# Altium footprint library Sigma_Library.PcbLib: 125 footprints (part 6 of 8)
Each footprint in its own frame and in the unit in brackets; x right, y up, seen from the top. Pads: shape width x height; smd on the part's side, far side on the other; paste and mask are expansions set on the pad; w line width, h text height; cw(c..) or ccw(c..) is an arc to the next point about the centre after c.
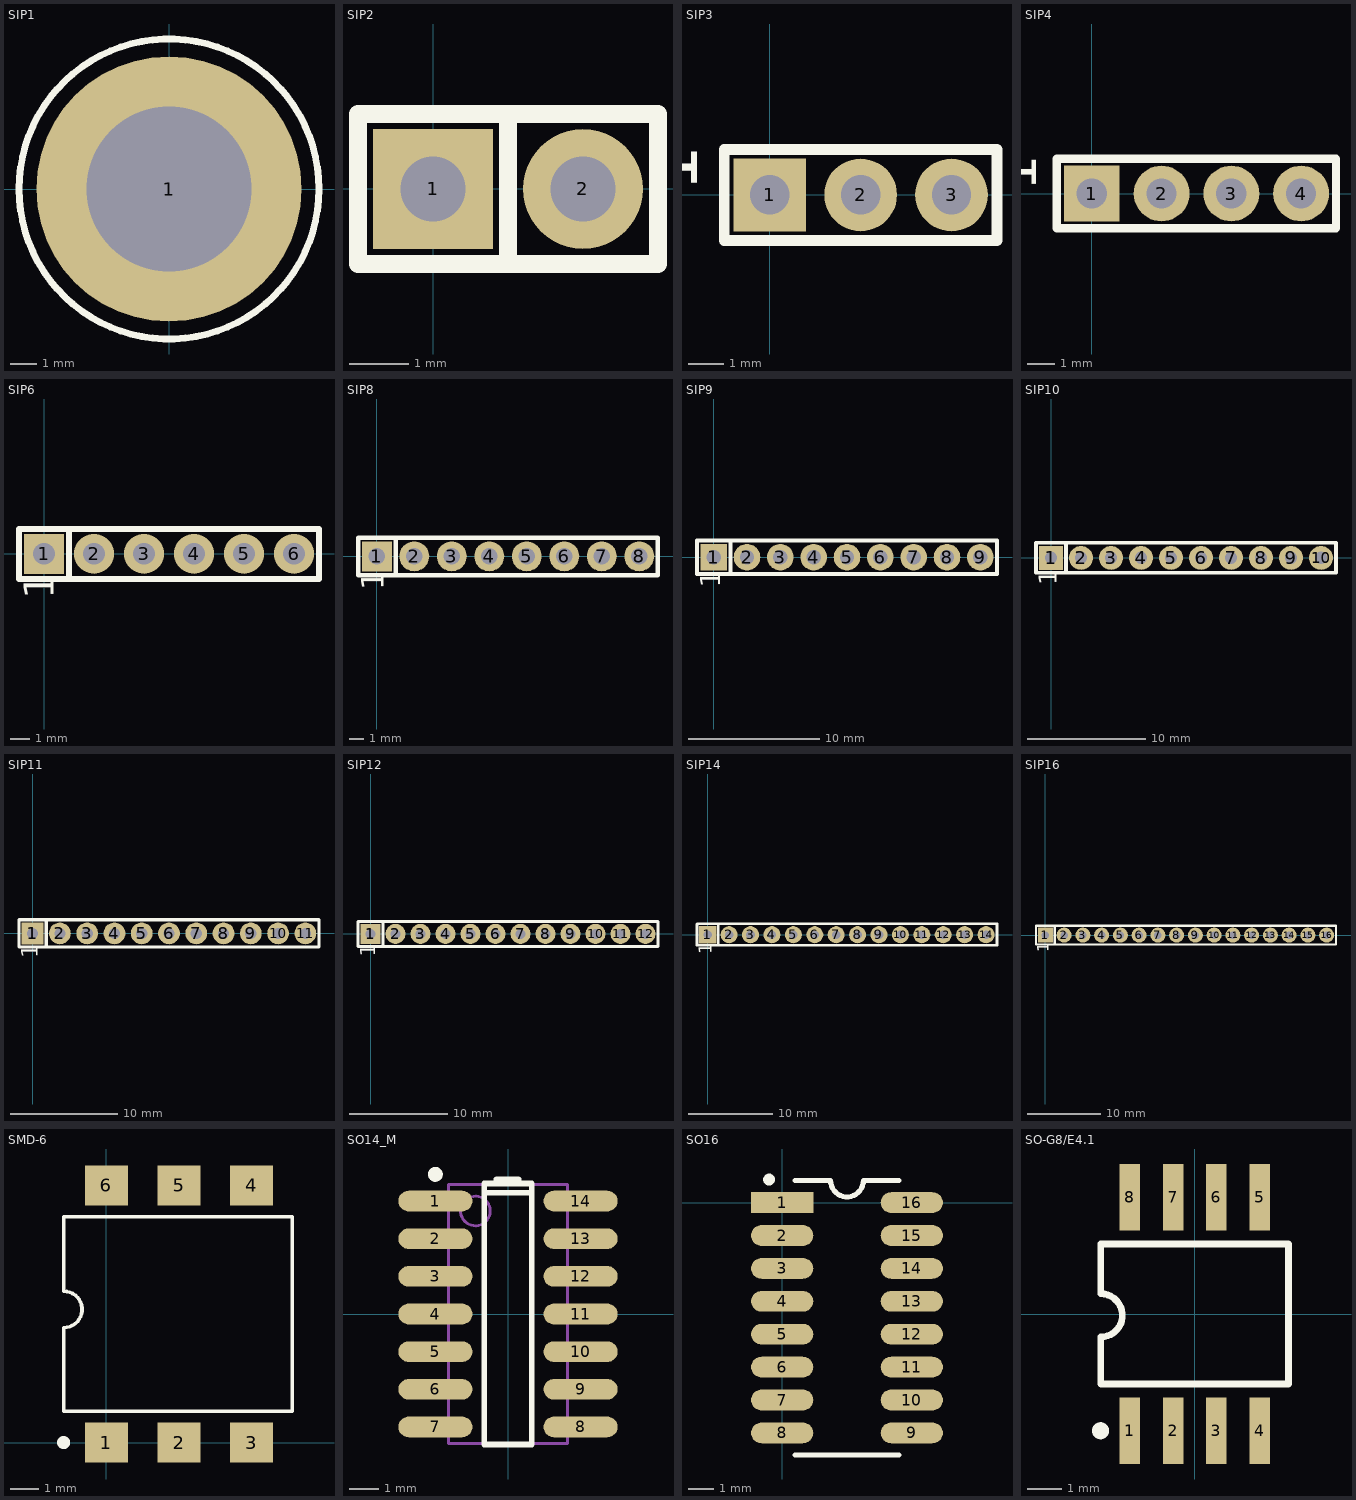
[diagram p5: the footprints below, top view; thin cyan lines are the x and y axes]

## SIP1 [mm] "Connector 1"
pads (1):
  round 10 hole 6.2: 1(0,0)
Top Overlay:
  circle w0.254: c0,0 r5.65
3D body "DS1021-1x1SF11.stp": height 8.6, standoff -3, extent -1.27,-1.27 1.27,1.27

## SIP2 [mil]
pads (2):
  rect 80x80 hole 43.31: 1(0,0)
  round 80 hole 43.31: 2(100,0)
Top Overlay:
  lines w12: 50,-50 50,50 ; -50,-50 150,-50 150,50 -50,50 -50,-50
3D body "Header1x2.STEP": height 333.79, standoff -98.49, extent -50,-45 150,55

## SIP3 [mil]
pads (3):
  rect 80x80 hole 43.31: 1(0,0)
  round 80 hole 43.31: 2(100,0) 3(200,0)
Top Overlay:
  lines w12: -50,-50 250,-50 250,50 -50,50 -50,-50
  text "1" at -80,3 h60
3D body "Header1x2.STEP": height 333.79, standoff -98.49, extent 50,-45 250,55
3D body "Header1x2.STEP": height 333.79, standoff -98.49, extent -50,-45 150,55

## SIP4 [mil]
pads (4):
  rect 80x80 hole 43.31: 1(0,0)
  round 80 hole 43.31: 2(100,0) 3(200,0) 4(300,0)
Top Overlay:
  lines w12: -50,-50 350,-50 350,50 -50,50 -50,-50
  text "1" at -80,3 h60
3D body "Header1x2.STEP": height 333.79, standoff -98.49, extent -50,-45 150,55
3D body "Header1x2.STEP": height 333.79, standoff -98.49, extent 150,-45 350,55

## SIP6 [mil]
pads (6):
  rect 80x80 hole 43.31: 1(0,0)
  round 80 hole 43.31: 2(100,0) 3(200,0) 4(300,0) 5(400,0) 6(500,0)
Top Overlay:
  lines w12: 50,-50 50,50 ; -50,-50 -50,50 550,50 550,-50 -50,-50
  text "1" at 19,-91 h60
3D body "DS1021-1x6SF11.stp": height 338.58, standoff -118.11, extent -51,-50 549,50

## SIP8 [mil]
pads (8):
  rect 80x80 hole 43.31: 1(0,0)
  round 80 hole 43.31: 2(100,0) 3(200,0) 4(300,0) 5(400,0) 6(500,0) 7(600,0) 8(700,0)
Top Overlay:
  lines w12: 50,-50 50,50 ; -50,-50 -50,50 750,50 750,-50 -50,-50
  text "1" at 19,-91 h60
3D body "DS1021-1x8SF11.stp": height 338.58, standoff -118.11, extent -50,-50 750,50

## SIP9 [mil]
pads (9):
  rect 80x80 hole 43.31: 1(0,0)
  round 80 hole 43.31: 2(100,0) 3(200,0) 4(300,0) 5(400,0) 6(500,0) 7(600,0) 8(700,0) 9(800,0)
Top Overlay:
  lines w12: 50,-50 50,50 ; 849,50 -50,50 -50,-50 850,-50 850,50
  text "1" at 19,-91 h60
3D body "DS1021-1x8SF11.stp": height 338.58, standoff -118.11, extent -50,-50 750,50

## SIP10 [mil]
pads (10):
  rect 80x80 hole 41: 1(0,0)
  round 80 hole 41: 2(100,0) 3(200,0) 4(300,0) 5(400,0) 6(500,0) 7(600,0) 8(700,0) 9(800,0) 10(900,0)
Top Overlay:
  lines w12: 50,-50 50,50 ; -50,-50 -50,50 950,50 950,-50 -50,-50
  text "1" at 19,-91 h60

## SIP11 [mil]
pads (11):
  rect 80x80 hole 41: 1(0,0)
  round 80 hole 41: 2(100,0) 3(200,0) 4(300,0) 5(400,0) 6(500,0) 7(600,0) 8(700,0) 9(800,0) 10(900,0) 11(1000,0)
Top Overlay:
  lines w12: 50,-50 50,50 ; -50,-50 1050,-50 1050,50 -50,50 -50,-50
  text "1" at 19,-91 h60

## SIP12 [mil]
pads (12):
  rect 80x80 hole 40: 1(0,0)
  round 80 hole 40: 2(100,0) 3(200,0) 4(300,0) 5(400,0) 6(500,0) 7(600,0) 8(700,0) 9(800,0) 10(900,0) 11(1000,0) 12(1100,0)
Top Overlay:
  lines w12: 50,-50 50,50 ; -50,-50 1150,-50 1150,50 -50,50 -50,-50
  text "1" at 19,-91 h60
3D body "DS1021-1x6SF11.stp": height 338.58, standoff -118.11, extent -51,-50 549,50
3D body "DS1021-1x6SF11.stp": height 338.58, standoff -118.11, extent 549,-50 1149,50

## SIP14 [mil]
pads (14):
  rect 80x80 hole 40: 1(0,0)
  round 80 hole 40: 2(100,0) 3(200,0) 4(300,0) 5(400,0) 6(500,0) 7(600,0) 8(700,0) 9(800,0) 10(900,0) 11(1000,0) 12(1100,0) 13(1200,0) 14(1300,0)
Top Overlay:
  lines w12: 50,-50 50,50 ; -50,-50 -50,50 1351.18,51.08 1351.18,-48.92 -50,-50
  text "1" at 19,-91 h60

## SIP16 [mil]
pads (16):
  rect 80x80 hole 40: 1(0,0)
  round 80 hole 40: 2(100,0) 3(200,0) 4(300,0) 5(400,0) 6(500,0) 7(600,0) 8(700,0) 9(800,0) 10(900,0) 11(1000,0) 12(1100,0) 13(1200,0) 14(1300,0) 15(1400,0) 16(1500,0)
Top Overlay:
  lines w12: 50,-50 50,50 ; -50,-50 1550,-50 1550,50 -50,50 -50,-50
  text "1" at 19,-91 h60

## SMD-6 [mm]
pads (6):
  rect 1.5x1.4 smd: 1(0,0) 2(2.54,0) 3(5.08,0) 4(5.08,9) 5(2.54,9) 6(0,9)
Top Overlay:
  circle w0.1: c-1.5,0 r0.18
  region: -1.506,-0.166 -1.542,-0.166 -1.608,-0.139 -1.658,-0.088 -1.686,-0.022 -1.686,0.014 -1.686,0.049 -1.658,0.115 -1.608,0.166 -1.542,0.193 -1.506,0.193 -1.47,0.193 -1.404,0.166 -1.354,0.115 -1.326,0.049 -1.326,0.014 -1.326,-0.022 -1.354,-0.088 -1.404,-0.139 -1.47,-0.166
  lines w0.127: -1.5,1.1 6.5,1.1 6.5,7.9 -1.5,7.9 ; -1.49,1.143 -1.49,4.024 ccw(c-1.49,4.659) -1.49,5.294 -1.49,7.874
3D body "S_TYPE_6_PIN.STEP": height 4.17, standoff -0.14, extent -1.058,-0.592 6.062,9.558

## SO14_M [mm] "14-Pin Small Outline Integrated Circuit 1.27 mm Pitch, IPC Low Density"
height 1.75
pads (14):
  oval 2.5x0.7 smd: 1(-2.45,3.81) 2(-2.45,2.54) 3(-2.45,1.27) 4(-2.45,0) 5(-2.45,-1.27) 6(-2.45,-2.54) 7(-2.45,-3.81) 8(2.45,-3.81) 9(2.45,-2.54) 10(2.45,-1.27) 11(2.45,0) 12(2.45,1.27) 13(2.45,2.54) 14(2.45,3.81)
Top Overlay:
  circle w0.25: c-2.45,4.71 r0.125
  lines w0.2: -0.8,4.089 0.8,4.089 ; -0.381,4.547 0.356,4.547 ; -0.8,-4.4 0.8,-4.4 0.8,4.4 -0.8,4.4 -0.8,-4.4
Mechanical 1:
  circle w0.1: c-1.1,3.475 r0.5
  lines w0.1: -2,-4.375 -2,4.375 2,4.375 2,-4.375 -2,-4.375
3D body: height 1.75, standoff 0, extent -2,-4.375 2,4.375

## SO16 [mm]
pads (16):
  rect 2.4x0.8 smd: 1(0,0)
  oval 2.4x0.8 smd: 2(0,-1.27) 3(0,-2.54) 4(0,-3.81) 5(0,-5.08) 6(0,-6.35) 7(0,-7.62) 8(0,-8.89) 9(5,-8.89) 10(5,-7.62) 11(5,-6.35) 12(5,-5.08) 13(5,-3.81) 14(5,-2.54) 15(5,-1.27) 16(5,0)
Top Overlay:
  circle w0.254: c-0.508,0.889 r0.1
  lines w0.2: 0.5,-9.745 4.5,-9.745 ; 0.5,0.855 1.865,0.855 ccw(c2.5,0.855) 3.135,0.855 4.5,0.855
3D body "SOIC-16.step": height 1.4, standoff 0, extent -0.587,-9.392 5.413,0.508

## SO-G8/E4.1 [mm] "Small Outline; 8 Leads; Body Width 5.3 mm; Pitch 1.27 mm"
height 2.03
pads (8):
  rect 0.6x1.95 smd: 1(-1.905,-3.425) 2(-0.635,-3.425) 3(0.635,-3.425) 4(1.905,-3.425) 5(1.905,3.425) 6(0.635,3.425) 7(-0.635,3.425) 8(-1.905,3.425)
Top Overlay:
  circle w0.25: c-2.765,-3.425 r0.125
  lines w0.2: -2.76,-2.04 -2.76,-0.675 ccw(c-2.76,-0.04) -2.76,0.595 -2.76,2.05 2.75,2.05 2.75,-2.05 -2.75,-2.05
3D body: height 1, standoff 0, extent -2.794,-2.032 2.794,2.032